# Altium footprint library 布洛电子PCB封装库-通用接插件.PcbLib: 103 footprints (part 4 of 7)
Each footprint in its own frame and in the unit in brackets; x right, y up, seen from the top. Pads: shape width x height; smd on the part's side, far side on the other; paste and mask are expansions set on the pad; w line width, h text height; cw(c..) or ccw(c..) is an arc to the next point about the centre after c.
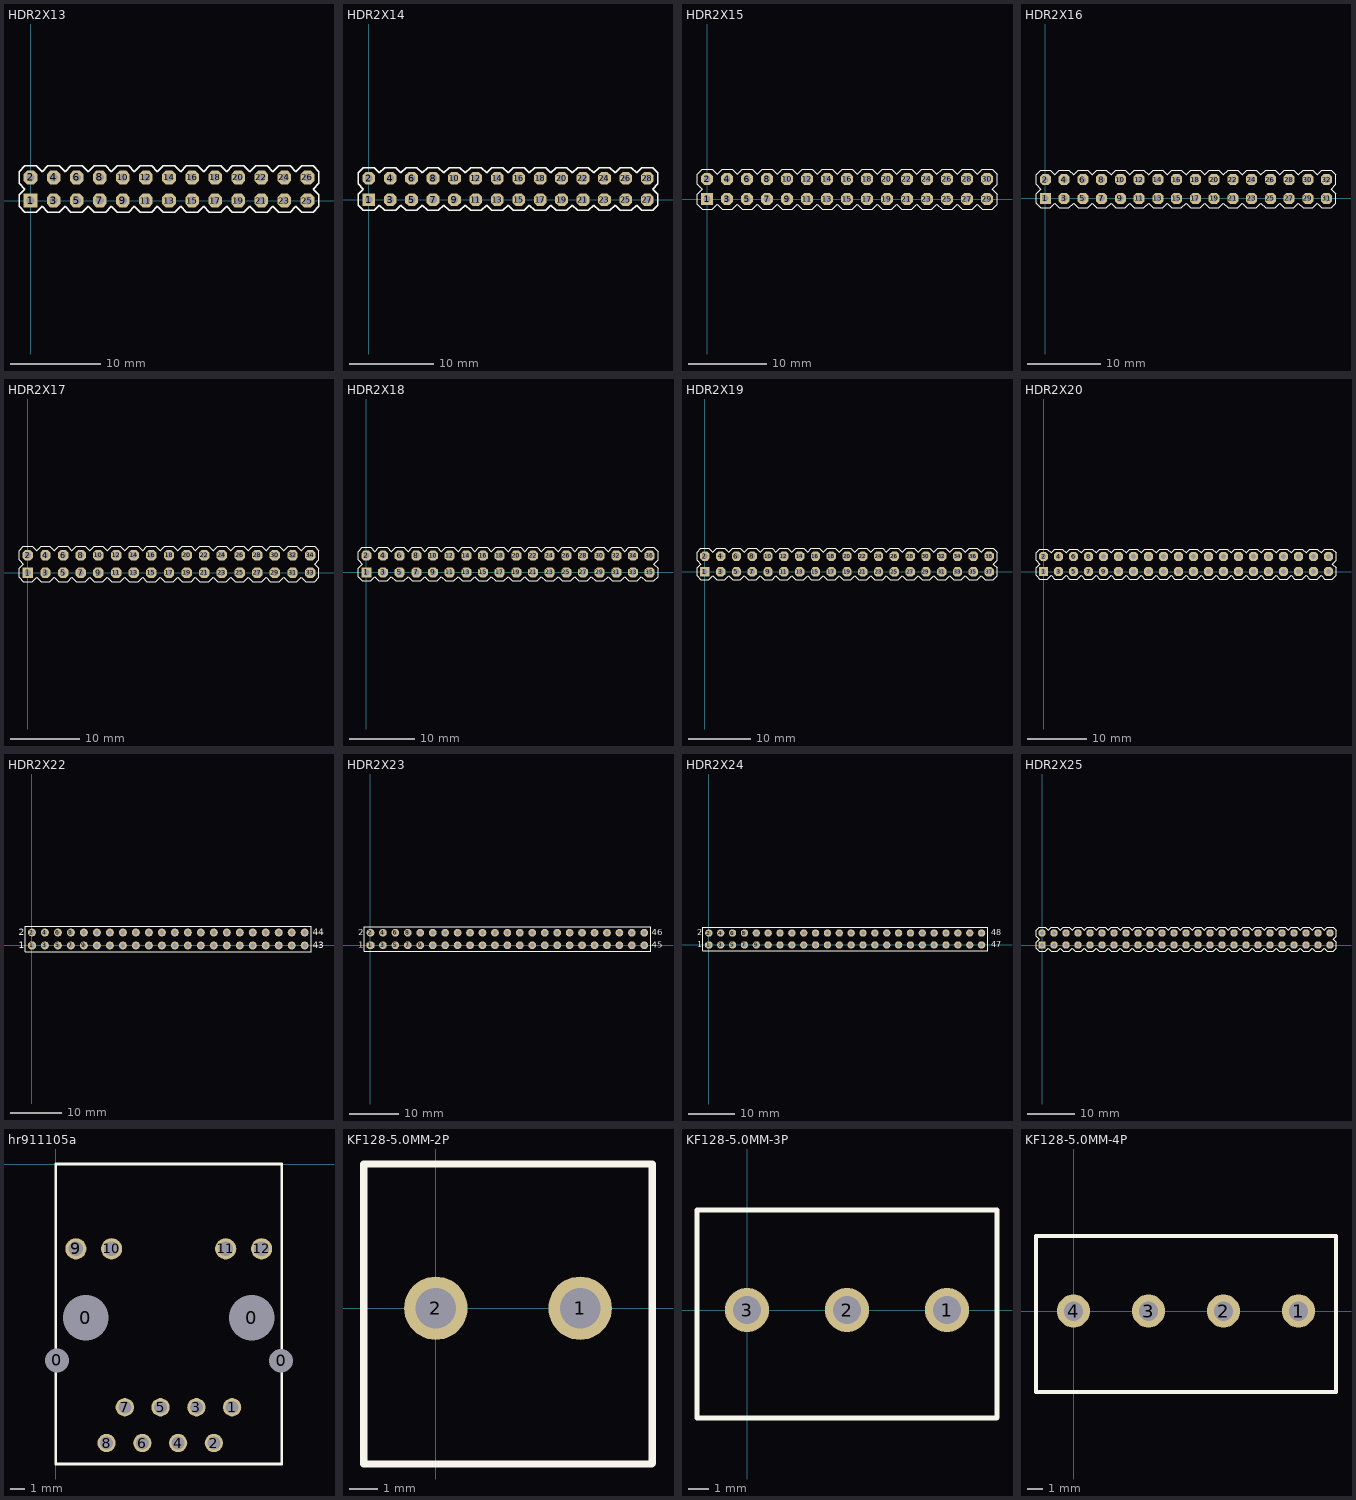
[diagram p3: the footprints below, top view; thin cyan lines are the x and y axes]

## HDR2X13 [mm] "Connector; Header; 13x2 Position"
pads (26):
  rect 1.5x1.5 hole 0.9: 1(0,0)
  oct 1.5x1.5 hole 0.9: 2(0,2.54) 3(2.54,0) 4(2.54,2.54) 5(5.08,0) 6(5.08,2.54) 7(7.62,0) 8(7.62,2.54) 9(10.16,0) 10(10.16,2.54) 11(12.7,0) 12(12.7,2.54) 13(15.24,0) 14(15.24,2.54) 15(17.78,0) 16(17.78,2.54) 17(20.32,0) 18(20.32,2.54) 19(22.86,0) 20(22.86,2.54) 21(25.4,0) 22(25.4,2.54) 23(27.94,0) 24(27.94,2.54) 25(30.48,0) 26(30.48,2.54)
Top Overlay:
  lines w0.152: -1.27,-0.635 -0.635,-1.27 0.635,-1.27 1.27,-0.635 1.905,-1.27 3.175,-1.27 3.81,-0.635 4.445,-1.27 5.715,-1.27 6.35,-0.635 6.985,-1.27 8.255,-1.27 8.89,-0.635 9.525,-1.27 10.795,-1.27 11.43,-0.635 12.065,-1.27 13.335,-1.27 13.97,-0.635 14.605,-1.27 15.875,-1.27 16.51,-0.635 17.145,-1.27 18.415,-1.27 19.05,-0.635 19.685,-1.27 20.955,-1.27 21.59,-0.635 22.225,-1.27 23.495,-1.27 24.13,-0.635 24.765,-1.27 26.035,-1.27 26.67,-0.635 27.305,-1.27 28.575,-1.27 29.21,-0.635 29.845,-1.27 31.115,-1.27 31.75,-0.635 31.75,0.635 31.115,1.27 31.75,1.905 31.75,3.175 31.115,3.81 29.845,3.81 29.21,3.175 28.575,3.81 27.305,3.81 26.67,3.175 26.035,3.81 24.765,3.81 24.13,3.175 23.495,3.81 22.225,3.81 21.59,3.175 20.955,3.81 19.685,3.81 19.05,3.175 18.415,3.81 17.145,3.81 16.51,3.175 15.875,3.81 14.605,3.81 13.97,3.175 13.335,3.81 12.065,3.81 11.43,3.175 10.795,3.81 9.525,3.81 8.89,3.175 8.255,3.81 6.985,3.81 6.35,3.175 5.715,3.81 4.445,3.81 3.81,3.175 3.175,3.81 1.905,3.81 1.27,3.175 0.635,3.81 -0.635,3.81 -1.27,3.175 -1.27,1.905 -0.635,1.27 -1.27,0.635 -1.27,-0.635
3D body: height 7.58, standoff -2.94, extent -1.27,1.27 1.27,3.81
3D body: height 7.58, standoff -2.94, extent -1.27,-1.27 1.27,1.27
3D body: height 7.58, standoff -2.94, extent 1.27,1.27 3.81,3.81
3D body: height 7.58, standoff -2.94, extent 1.27,-1.27 3.81,1.27
3D body: height 7.58, standoff -2.94, extent 3.81,1.27 6.35,3.81
3D body: height 7.58, standoff -2.94, extent 3.81,-1.27 6.35,1.27
3D body: height 7.58, standoff -2.94, extent 6.35,1.27 8.89,3.81
3D body: height 7.58, standoff -2.94, extent 6.35,-1.27 8.89,1.27
3D body: height 7.58, standoff -2.94, extent 8.89,1.27 11.43,3.81
3D body: height 7.58, standoff -2.94, extent 8.89,-1.27 11.43,1.27
3D body: height 7.58, standoff -2.94, extent 11.43,1.27 13.97,3.81
3D body: height 7.58, standoff -2.94, extent 11.43,-1.27 13.97,1.27
3D body: height 7.58, standoff -2.94, extent 13.97,1.27 16.51,3.81
3D body: height 7.58, standoff -2.94, extent 13.97,-1.27 16.51,1.27
3D body: height 7.58, standoff -2.94, extent 16.51,1.27 19.05,3.81
3D body: height 7.58, standoff -2.94, extent 16.51,-1.27 19.05,1.27
3D body: height 7.58, standoff -2.94, extent 19.05,1.27 21.59,3.81
3D body: height 7.58, standoff -2.94, extent 19.05,-1.27 21.59,1.27
3D body: height 7.58, standoff -2.94, extent 21.59,1.27 24.13,3.81
3D body: height 7.58, standoff -2.94, extent 21.59,-1.27 24.13,1.27
3D body: height 7.58, standoff -2.94, extent 24.13,1.27 26.67,3.81
3D body: height 7.58, standoff -2.94, extent 24.13,-1.27 26.67,1.27
3D body: height 7.58, standoff -2.94, extent 26.67,1.27 29.21,3.81
3D body: height 7.58, standoff -2.94, extent 26.67,-1.27 29.21,1.27
3D body: height 7.58, standoff -2.94, extent 29.21,1.27 31.75,3.81
3D body: height 7.58, standoff -2.94, extent 29.21,-1.27 31.75,1.27

## HDR2X14 [mm] "Connector; Header; 14x2 Position"
pads (28):
  rect 1.5x1.5 hole 0.9: 1(0,0)
  oct 1.5x1.5 hole 0.9: 2(0,2.54) 3(2.54,0) 4(2.54,2.54) 5(5.08,0) 6(5.08,2.54) 7(7.62,0) 8(7.62,2.54) 9(10.16,0) 10(10.16,2.54) 11(12.7,0) 12(12.7,2.54) 13(15.24,0) 14(15.24,2.54) 15(17.78,0) 16(17.78,2.54) 17(20.32,0) 18(20.32,2.54) 19(22.86,0) 20(22.86,2.54) 21(25.4,0) 22(25.4,2.54) 23(27.94,0) 24(27.94,2.54) 25(30.48,0) 26(30.48,2.54) 27(33.02,0) 28(33.02,2.54)
Top Overlay:
  lines w0.152: -1.27,-0.635 -1.27,0.635 -0.635,1.27 -1.27,1.905 -1.27,3.175 -0.635,3.81 0.635,3.81 1.27,3.175 1.905,3.81 3.175,3.81 3.81,3.175 4.445,3.81 5.715,3.81 6.35,3.175 6.985,3.81 8.255,3.81 8.89,3.175 9.525,3.81 10.795,3.81 11.43,3.175 12.065,3.81 13.335,3.81 13.97,3.175 14.605,3.81 15.875,3.81 16.51,3.175 17.145,3.81 18.415,3.81 19.05,3.175 19.685,3.81 20.955,3.81 21.59,3.175 22.225,3.81 23.495,3.81 24.13,3.175 24.765,3.81 26.035,3.81 26.67,3.175 27.305,3.81 28.575,3.81 29.21,3.175 29.845,3.81 31.115,3.81 31.75,3.175 32.385,3.81 33.655,3.81 34.29,3.175 34.29,1.905 33.655,1.27 34.29,0.635 34.29,-0.635 33.655,-1.27 32.385,-1.27 31.75,-0.635 31.115,-1.27 29.845,-1.27 29.21,-0.635 28.575,-1.27 27.305,-1.27 26.67,-0.635 26.035,-1.27 24.765,-1.27 24.13,-0.635 23.495,-1.27 22.225,-1.27 21.59,-0.635 20.955,-1.27 19.685,-1.27 19.05,-0.635 18.415,-1.27 17.145,-1.27 16.51,-0.635 15.875,-1.27 14.605,-1.27 13.97,-0.635 13.335,-1.27 12.065,-1.27 11.43,-0.635 10.795,-1.27 9.525,-1.27 8.89,-0.635 8.255,-1.27 6.985,-1.27 6.35,-0.635 5.715,-1.27 4.445,-1.27 3.81,-0.635 3.175,-1.27 1.905,-1.27 1.27,-0.635 0.635,-1.27 -0.635,-1.27 -1.27,-0.635
3D body: height 7.58, standoff -2.94, extent -1.27,-1.27 1.27,1.27
3D body: height 7.58, standoff -2.94, extent 1.27,-1.27 3.81,1.27
3D body: height 7.58, standoff -2.94, extent 3.81,-1.27 6.35,1.27
3D body: height 7.58, standoff -2.94, extent 6.35,-1.27 8.89,1.27
3D body: height 7.58, standoff -2.94, extent -1.27,1.27 1.27,3.81
3D body: height 7.58, standoff -2.94, extent 1.27,1.27 3.81,3.81
3D body: height 7.58, standoff -2.94, extent 3.81,1.27 6.35,3.81
3D body: height 7.58, standoff -2.94, extent 6.35,1.27 8.89,3.81
3D body: height 7.58, standoff -2.94, extent 8.89,-1.27 11.43,1.27
3D body: height 7.58, standoff -2.94, extent 11.43,-1.27 13.97,1.27
3D body: height 7.58, standoff -2.94, extent 13.97,-1.27 16.51,1.27
3D body: height 7.58, standoff -2.94, extent 16.51,-1.27 19.05,1.27
3D body: height 7.58, standoff -2.94, extent 8.89,1.27 11.43,3.81
3D body: height 7.58, standoff -2.94, extent 11.43,1.27 13.97,3.81
3D body: height 7.58, standoff -2.94, extent 13.97,1.27 16.51,3.81
3D body: height 7.58, standoff -2.94, extent 16.51,1.27 19.05,3.81
3D body: height 7.58, standoff -2.94, extent 19.05,-1.27 21.59,1.27
3D body: height 7.58, standoff -2.94, extent 21.59,-1.27 24.13,1.27
3D body: height 7.58, standoff -2.94, extent 24.13,-1.27 26.67,1.27
3D body: height 7.58, standoff -2.94, extent 26.67,-1.27 29.21,1.27
3D body: height 7.58, standoff -2.94, extent 19.05,1.27 21.59,3.81
3D body: height 7.58, standoff -2.94, extent 21.59,1.27 24.13,3.81
3D body: height 7.58, standoff -2.94, extent 24.13,1.27 26.67,3.81
3D body: height 7.58, standoff -2.94, extent 26.67,1.27 29.21,3.81
3D body: height 7.58, standoff -2.94, extent 29.21,-1.27 31.75,1.27
3D body: height 7.58, standoff -2.94, extent 31.75,-1.27 34.29,1.27
3D body: height 7.58, standoff -2.94, extent 29.21,1.27 31.75,3.81
3D body: height 7.58, standoff -2.94, extent 31.75,1.27 34.29,3.81

## HDR2X15 [mm] "Connector; Header; 15x2 Position"
pads (30):
  rect 1.5x1.5 hole 0.9: 1(0,0)
  oct 1.5x1.5 hole 0.9: 2(0,2.54) 3(2.54,0) 4(2.54,2.54) 5(5.08,0) 6(5.08,2.54) 7(7.62,0) 8(7.62,2.54) 9(10.16,0) 10(10.16,2.54) 11(12.7,0) 12(12.7,2.54) 13(15.24,0) 14(15.24,2.54) 15(17.78,0) 16(17.78,2.54) 17(20.32,0) 18(20.32,2.54) 19(22.86,0) 20(22.86,2.54) 21(25.4,0) 22(25.4,2.54) 23(27.94,0) 24(27.94,2.54) 25(30.48,0) 26(30.48,2.54) 27(33.02,0) 28(33.02,2.54) 29(35.56,0) 30(35.56,2.54)
Top Overlay:
  lines w0.152: -1.27,-0.635 -1.27,0.635 -0.635,1.27 -1.27,1.905 -1.27,3.175 -0.635,3.81 0.635,3.81 1.27,3.175 1.905,3.81 3.175,3.81 3.81,3.175 4.445,3.81 5.715,3.81 6.35,3.175 6.985,3.81 8.255,3.81 8.89,3.175 9.525,3.81 10.795,3.81 11.43,3.175 12.065,3.81 13.335,3.81 13.97,3.175 14.605,3.81 15.875,3.81 16.51,3.175 17.145,3.81 18.415,3.81 19.05,3.175 19.685,3.81 20.955,3.81 21.59,3.175 22.225,3.81 23.495,3.81 24.13,3.175 24.765,3.81 26.035,3.81 26.67,3.175 27.305,3.81 28.575,3.81 29.21,3.175 29.845,3.81 31.115,3.81 31.75,3.175 32.385,3.81 33.655,3.81 34.29,3.175 34.925,3.81 36.195,3.81 36.83,3.175 36.83,1.905 36.195,1.27 36.83,0.635 36.83,-0.635 36.195,-1.27 34.925,-1.27 34.29,-0.635 33.655,-1.27 32.385,-1.27 31.75,-0.635 31.115,-1.27 29.845,-1.27 29.21,-0.635 28.575,-1.27 27.305,-1.27 26.67,-0.635 26.035,-1.27 24.765,-1.27 24.13,-0.635 23.495,-1.27 22.225,-1.27 21.59,-0.635 20.955,-1.27 19.685,-1.27 19.05,-0.635 18.415,-1.27 17.145,-1.27 16.51,-0.635 15.875,-1.27 14.605,-1.27 13.97,-0.635 13.335,-1.27 12.065,-1.27 11.43,-0.635 10.795,-1.27 9.525,-1.27 8.89,-0.635 8.255,-1.27 6.985,-1.27 6.35,-0.635 5.715,-1.27 4.445,-1.27 3.81,-0.635 3.175,-1.27 1.905,-1.27 1.27,-0.635 0.635,-1.27 -0.635,-1.27 -1.27,-0.635
3D body: height 7.58, standoff -2.94, extent 34.29,1.27 36.83,3.81
3D body: height 7.58, standoff -2.94, extent 31.75,1.27 34.29,3.81
3D body: height 7.58, standoff -2.94, extent 29.21,1.27 31.75,3.81
3D body: height 7.58, standoff -2.94, extent 34.29,-1.27 36.83,1.27
3D body: height 7.58, standoff -2.94, extent 31.75,-1.27 34.29,1.27
3D body: height 7.58, standoff -2.94, extent 29.21,-1.27 31.75,1.27
3D body: height 7.58, standoff -2.94, extent 26.67,1.27 29.21,3.81
3D body: height 7.58, standoff -2.94, extent 24.13,1.27 26.67,3.81
3D body: height 7.58, standoff -2.94, extent 21.59,1.27 24.13,3.81
3D body: height 7.58, standoff -2.94, extent 19.05,1.27 21.59,3.81
3D body: height 7.58, standoff -2.94, extent 26.67,-1.27 29.21,1.27
3D body: height 7.58, standoff -2.94, extent 24.13,-1.27 26.67,1.27
3D body: height 7.58, standoff -2.94, extent 21.59,-1.27 24.13,1.27
3D body: height 7.58, standoff -2.94, extent 19.05,-1.27 21.59,1.27
3D body: height 7.58, standoff -2.94, extent 16.51,1.27 19.05,3.81
3D body: height 7.58, standoff -2.94, extent 13.97,1.27 16.51,3.81
3D body: height 7.58, standoff -2.94, extent 11.43,1.27 13.97,3.81
3D body: height 7.58, standoff -2.94, extent 8.89,1.27 11.43,3.81
3D body: height 7.58, standoff -2.94, extent 16.51,-1.27 19.05,1.27
3D body: height 7.58, standoff -2.94, extent 13.97,-1.27 16.51,1.27
3D body: height 7.58, standoff -2.94, extent 11.43,-1.27 13.97,1.27
3D body: height 7.58, standoff -2.94, extent 8.89,-1.27 11.43,1.27
3D body: height 7.58, standoff -2.94, extent 6.35,1.27 8.89,3.81
3D body: height 7.58, standoff -2.94, extent 3.81,1.27 6.35,3.81
3D body: height 7.58, standoff -2.94, extent 1.27,1.27 3.81,3.81
3D body: height 7.58, standoff -2.94, extent -1.27,1.27 1.27,3.81
3D body: height 7.58, standoff -2.94, extent 6.35,-1.27 8.89,1.27
3D body: height 7.58, standoff -2.94, extent 3.81,-1.27 6.35,1.27
3D body: height 7.58, standoff -2.94, extent 1.27,-1.27 3.81,1.27
3D body: height 7.58, standoff -2.94, extent -1.27,-1.27 1.27,1.27

## HDR2X16 [mm] "Connector; Header; 16x2 Position"
pads (32):
  rect 1.5x1.5 hole 0.9: 1(0,0)
  oct 1.5x1.5 hole 0.9: 2(0,2.54) 3(2.54,0) 4(2.54,2.54) 5(5.08,0) 6(5.08,2.54) 7(7.62,0) 8(7.62,2.54) 9(10.16,0) 10(10.16,2.54) 11(12.7,0) 12(12.7,2.54) 13(15.24,0) 14(15.24,2.54) 15(17.78,0) 16(17.78,2.54) 17(20.32,0) 18(20.32,2.54) 19(22.86,0) 20(22.86,2.54) 21(25.4,0) 22(25.4,2.54) 23(27.94,0) 24(27.94,2.54) 25(30.48,0) 26(30.48,2.54) 27(33.02,0) 28(33.02,2.54) 29(35.56,0) 30(35.56,2.54) 31(38.1,0) 32(38.1,2.54)
Top Overlay:
  lines w0.152: -1.27,-0.635 -1.27,0.635 -0.635,1.27 -1.27,1.905 -1.27,3.175 -0.635,3.81 0.635,3.81 1.27,3.175 1.905,3.81 3.175,3.81 3.81,3.175 4.445,3.81 5.715,3.81 6.35,3.175 6.985,3.81 8.255,3.81 8.89,3.175 9.525,3.81 10.795,3.81 11.43,3.175 12.065,3.81 13.335,3.81 13.97,3.175 14.605,3.81 15.875,3.81 16.51,3.175 17.145,3.81 18.415,3.81 19.05,3.175 19.685,3.81 20.955,3.81 21.59,3.175 22.225,3.81 23.495,3.81 24.13,3.175 24.765,3.81 26.035,3.81 26.67,3.175 27.305,3.81 28.575,3.81 29.21,3.175 29.845,3.81 31.115,3.81 31.75,3.175 32.385,3.81 33.655,3.81 34.29,3.175 34.925,3.81 36.195,3.81 36.83,3.175 37.465,3.81 38.735,3.81 39.37,3.175 39.37,1.905 38.735,1.27 39.37,0.635 39.37,-0.635 38.735,-1.27 37.465,-1.27 36.83,-0.635 36.195,-1.27 34.925,-1.27 34.29,-0.635 33.655,-1.27 32.385,-1.27 31.75,-0.635 31.115,-1.27 29.845,-1.27 29.21,-0.635 28.575,-1.27 27.305,-1.27 26.67,-0.635 26.035,-1.27 24.765,-1.27 24.13,-0.635 23.495,-1.27 22.225,-1.27 21.59,-0.635 20.955,-1.27 19.685,-1.27 19.05,-0.635 18.415,-1.27 17.145,-1.27 16.51,-0.635 15.875,-1.27 14.605,-1.27 13.97,-0.635 13.335,-1.27 12.065,-1.27 11.43,-0.635 10.795,-1.27 9.525,-1.27 8.89,-0.635 8.255,-1.27 6.985,-1.27 6.35,-0.635 5.715,-1.27 4.445,-1.27 3.81,-0.635 3.175,-1.27 1.905,-1.27 1.27,-0.635 0.635,-1.27 -0.635,-1.27 -1.27,-0.635
3D body: height 7.58, standoff -2.94, extent -1.27,-1.27 1.27,1.27
3D body: height 7.58, standoff -2.94, extent 1.27,-1.27 3.81,1.27
3D body: height 7.58, standoff -2.94, extent 3.81,-1.27 6.35,1.27
3D body: height 7.58, standoff -2.94, extent 6.35,-1.27 8.89,1.27
3D body: height 7.58, standoff -2.94, extent -1.27,1.27 1.27,3.81
3D body: height 7.58, standoff -2.94, extent 1.27,1.27 3.81,3.81
3D body: height 7.58, standoff -2.94, extent 3.81,1.27 6.35,3.81
3D body: height 7.58, standoff -2.94, extent 6.35,1.27 8.89,3.81
3D body: height 7.58, standoff -2.94, extent 8.89,-1.27 11.43,1.27
3D body: height 7.58, standoff -2.94, extent 11.43,-1.27 13.97,1.27
3D body: height 7.58, standoff -2.94, extent 13.97,-1.27 16.51,1.27
3D body: height 7.58, standoff -2.94, extent 16.51,-1.27 19.05,1.27
3D body: height 7.58, standoff -2.94, extent 8.89,1.27 11.43,3.81
3D body: height 7.58, standoff -2.94, extent 11.43,1.27 13.97,3.81
3D body: height 7.58, standoff -2.94, extent 13.97,1.27 16.51,3.81
3D body: height 7.58, standoff -2.94, extent 16.51,1.27 19.05,3.81
3D body: height 7.58, standoff -2.94, extent 19.05,-1.27 21.59,1.27
3D body: height 7.58, standoff -2.94, extent 21.59,-1.27 24.13,1.27
3D body: height 7.58, standoff -2.94, extent 24.13,-1.27 26.67,1.27
3D body: height 7.58, standoff -2.94, extent 26.67,-1.27 29.21,1.27
3D body: height 7.58, standoff -2.94, extent 19.05,1.27 21.59,3.81
3D body: height 7.58, standoff -2.94, extent 21.59,1.27 24.13,3.81
3D body: height 7.58, standoff -2.94, extent 24.13,1.27 26.67,3.81
3D body: height 7.58, standoff -2.94, extent 26.67,1.27 29.21,3.81
3D body: height 7.58, standoff -2.94, extent 29.21,-1.27 31.75,1.27
3D body: height 7.58, standoff -2.94, extent 31.75,-1.27 34.29,1.27
3D body: height 7.58, standoff -2.94, extent 34.29,-1.27 36.83,1.27
3D body: height 7.58, standoff -2.94, extent 36.83,-1.27 39.37,1.27
3D body: height 7.58, standoff -2.94, extent 29.21,1.27 31.75,3.81
3D body: height 7.58, standoff -2.94, extent 31.75,1.27 34.29,3.81
3D body: height 7.58, standoff -2.94, extent 34.29,1.27 36.83,3.81
3D body: height 7.58, standoff -2.94, extent 36.83,1.27 39.37,3.81

## HDR2X17 [mm] "Connector; Header; 17x2 Position"
pads (34):
  rect 1.5x1.5 hole 0.9: 1(0,0)
  oct 1.5x1.5 hole 0.9: 2(0,2.54) 3(2.54,0) 4(2.54,2.54) 5(5.08,0) 6(5.08,2.54) 7(7.62,0) 8(7.62,2.54) 9(10.16,0) 10(10.16,2.54) 11(12.7,0) 12(12.7,2.54) 13(15.24,0) 14(15.24,2.54) 15(17.78,0) 16(17.78,2.54) 17(20.32,0) 18(20.32,2.54) 19(22.86,0) 20(22.86,2.54) 21(25.4,0) 22(25.4,2.54) 23(27.94,0) 24(27.94,2.54) 25(30.48,0) 26(30.48,2.54) 27(33.02,0) 28(33.02,2.54) 29(35.56,0) 30(35.56,2.54) 31(38.1,0) 32(38.1,2.54) 33(40.64,0) 34(40.64,2.54)
Top Overlay:
  lines w0.152: -1.27,-0.635 -0.635,-1.27 0.635,-1.27 1.27,-0.635 1.905,-1.27 3.175,-1.27 3.81,-0.635 4.445,-1.27 5.715,-1.27 6.35,-0.635 6.985,-1.27 8.255,-1.27 8.89,-0.635 9.525,-1.27 10.795,-1.27 11.43,-0.635 12.065,-1.27 13.335,-1.27 13.97,-0.635 14.605,-1.27 15.875,-1.27 16.51,-0.635 17.145,-1.27 18.415,-1.27 19.05,-0.635 19.685,-1.27 20.955,-1.27 21.59,-0.635 22.225,-1.27 23.495,-1.27 24.13,-0.635 24.765,-1.27 26.035,-1.27 26.67,-0.635 27.305,-1.27 28.575,-1.27 29.21,-0.635 29.845,-1.27 31.115,-1.27 31.75,-0.635 32.385,-1.27 33.655,-1.27 34.29,-0.635 34.925,-1.27 36.195,-1.27 36.83,-0.635 37.465,-1.27 38.735,-1.27 39.37,-0.635 40.005,-1.27 41.275,-1.27 41.91,-0.635 41.91,0.635 41.275,1.27 41.91,1.905 41.91,3.175 41.275,3.81 40.005,3.81 39.37,3.175 38.735,3.81 37.465,3.81 36.83,3.175 36.195,3.81 34.925,3.81 34.29,3.175 33.655,3.81 32.385,3.81 31.75,3.175 31.115,3.81 29.845,3.81 29.21,3.175 28.575,3.81 27.305,3.81 26.67,3.175 26.035,3.81 24.765,3.81 24.13,3.175 23.495,3.81 22.225,3.81 21.59,3.175 20.955,3.81 19.685,3.81 19.05,3.175 18.415,3.81 17.145,3.81 16.51,3.175 15.875,3.81 14.605,3.81 13.97,3.175 13.335,3.81 12.065,3.81 11.43,3.175 10.795,3.81 9.525,3.81 8.89,3.175 8.255,3.81 6.985,3.81 6.35,3.175 5.715,3.81 4.445,3.81 3.81,3.175 3.175,3.81 1.905,3.81 1.27,3.175 0.635,3.81 -0.635,3.81 -1.27,3.175 -1.27,1.905 -0.635,1.27 -1.27,0.635 -1.27,-0.635
3D body: height 7.58, standoff -2.94, extent 39.37,1.27 41.91,3.81
3D body: height 7.58, standoff -2.94, extent 39.37,-1.27 41.91,1.27
3D body: height 7.58, standoff -2.94, extent 36.83,1.27 39.37,3.81
3D body: height 7.58, standoff -2.94, extent 34.29,1.27 36.83,3.81
3D body: height 7.58, standoff -2.94, extent 31.75,1.27 34.29,3.81
3D body: height 7.58, standoff -2.94, extent 29.21,1.27 31.75,3.81
3D body: height 7.58, standoff -2.94, extent 36.83,-1.27 39.37,1.27
3D body: height 7.58, standoff -2.94, extent 34.29,-1.27 36.83,1.27
3D body: height 7.58, standoff -2.94, extent 31.75,-1.27 34.29,1.27
3D body: height 7.58, standoff -2.94, extent 29.21,-1.27 31.75,1.27
3D body: height 7.58, standoff -2.94, extent 26.67,1.27 29.21,3.81
3D body: height 7.58, standoff -2.94, extent 24.13,1.27 26.67,3.81
3D body: height 7.58, standoff -2.94, extent 21.59,1.27 24.13,3.81
3D body: height 7.58, standoff -2.94, extent 19.05,1.27 21.59,3.81
3D body: height 7.58, standoff -2.94, extent 26.67,-1.27 29.21,1.27
3D body: height 7.58, standoff -2.94, extent 24.13,-1.27 26.67,1.27
3D body: height 7.58, standoff -2.94, extent 21.59,-1.27 24.13,1.27
3D body: height 7.58, standoff -2.94, extent 19.05,-1.27 21.59,1.27
3D body: height 7.58, standoff -2.94, extent 16.51,1.27 19.05,3.81
3D body: height 7.58, standoff -2.94, extent 13.97,1.27 16.51,3.81
3D body: height 7.58, standoff -2.94, extent 11.43,1.27 13.97,3.81
3D body: height 7.58, standoff -2.94, extent 8.89,1.27 11.43,3.81
3D body: height 7.58, standoff -2.94, extent 16.51,-1.27 19.05,1.27
3D body: height 7.58, standoff -2.94, extent 13.97,-1.27 16.51,1.27
3D body: height 7.58, standoff -2.94, extent 11.43,-1.27 13.97,1.27
3D body: height 7.58, standoff -2.94, extent 8.89,-1.27 11.43,1.27
3D body: height 7.58, standoff -2.94, extent 6.35,1.27 8.89,3.81
3D body: height 7.58, standoff -2.94, extent 3.81,1.27 6.35,3.81
3D body: height 7.58, standoff -2.94, extent 1.27,1.27 3.81,3.81
3D body: height 7.58, standoff -2.94, extent -1.27,1.27 1.27,3.81
3D body: height 7.58, standoff -2.94, extent 6.35,-1.27 8.89,1.27
3D body: height 7.58, standoff -2.94, extent 3.81,-1.27 6.35,1.27
3D body: height 7.58, standoff -2.94, extent 1.27,-1.27 3.81,1.27
3D body: height 7.58, standoff -2.94, extent -1.27,-1.27 1.27,1.27

## HDR2X18 [mm] "Connector; Header; 18x2 Position"
pads (36):
  rect 1.5x1.5 hole 0.9: 1(0,0)
  oct 1.5x1.5 hole 0.9: 2(0,2.54) 3(2.54,0) 4(2.54,2.54) 5(5.08,0) 6(5.08,2.54) 7(7.62,0) 8(7.62,2.54) 9(10.16,0) 10(10.16,2.54) 11(12.7,0) 12(12.7,2.54) 13(15.24,0) 14(15.24,2.54) 15(17.78,0) 16(17.78,2.54) 17(20.32,0) 18(20.32,2.54) 19(22.86,0) 20(22.86,2.54) 21(25.4,0) 22(25.4,2.54) 23(27.94,0) 24(27.94,2.54) 25(30.48,0) 26(30.48,2.54) 27(33.02,0) 28(33.02,2.54) 29(35.56,0) 30(35.56,2.54) 31(38.1,0) 32(38.1,2.54) 33(40.64,0) 34(40.64,2.54) 35(43.18,0) 36(43.18,2.54)
Top Overlay:
  lines w0.152: -1.27,-0.635 -1.27,0.635 -0.635,1.27 -1.27,1.905 -1.27,3.175 -0.635,3.81 0.635,3.81 1.27,3.175 1.905,3.81 3.175,3.81 3.81,3.175 4.445,3.81 5.715,3.81 6.35,3.175 6.985,3.81 8.255,3.81 8.89,3.175 9.525,3.81 10.795,3.81 11.43,3.175 12.065,3.81 13.335,3.81 13.97,3.175 14.605,3.81 15.875,3.81 16.51,3.175 17.145,3.81 18.415,3.81 19.05,3.175 19.685,3.81 20.955,3.81 21.59,3.175 22.225,3.81 23.495,3.81 24.13,3.175 24.765,3.81 26.035,3.81 26.67,3.175 27.305,3.81 28.575,3.81 29.21,3.175 29.845,3.81 31.115,3.81 31.75,3.175 32.385,3.81 33.655,3.81 34.29,3.175 34.925,3.81 36.195,3.81 36.83,3.175 37.465,3.81 38.735,3.81 39.37,3.175 40.005,3.81 41.275,3.81 41.91,3.175 42.545,3.81 43.815,3.81 44.45,3.175 44.45,1.905 43.815,1.27 44.45,0.635 44.45,-0.635 43.815,-1.27 42.545,-1.27 41.91,-0.635 41.275,-1.27 40.005,-1.27 39.37,-0.635 38.735,-1.27 37.465,-1.27 36.83,-0.635 36.195,-1.27 34.925,-1.27 34.29,-0.635 33.655,-1.27 32.385,-1.27 31.75,-0.635 31.115,-1.27 29.845,-1.27 29.21,-0.635 28.575,-1.27 27.305,-1.27 26.67,-0.635 26.035,-1.27 24.765,-1.27 24.13,-0.635 23.495,-1.27 22.225,-1.27 21.59,-0.635 20.955,-1.27 19.685,-1.27 19.05,-0.635 18.415,-1.27 17.145,-1.27 16.51,-0.635 15.875,-1.27 14.605,-1.27 13.97,-0.635 13.335,-1.27 12.065,-1.27 11.43,-0.635 10.795,-1.27 9.525,-1.27 8.89,-0.635 8.255,-1.27 6.985,-1.27 6.35,-0.635 5.715,-1.27 4.445,-1.27 3.81,-0.635 3.175,-1.27 1.905,-1.27 1.27,-0.635 0.635,-1.27 -0.635,-1.27 -1.27,-0.635
3D body: height 7.58, standoff -2.94, extent -1.27,-1.27 1.27,1.27
3D body: height 7.58, standoff -2.94, extent 1.27,-1.27 3.81,1.27
3D body: height 7.58, standoff -2.94, extent 3.81,-1.27 6.35,1.27
3D body: height 7.58, standoff -2.94, extent 6.35,-1.27 8.89,1.27
3D body: height 7.58, standoff -2.94, extent -1.27,1.27 1.27,3.81
3D body: height 7.58, standoff -2.94, extent 1.27,1.27 3.81,3.81
3D body: height 7.58, standoff -2.94, extent 3.81,1.27 6.35,3.81
3D body: height 7.58, standoff -2.94, extent 6.35,1.27 8.89,3.81
3D body: height 7.58, standoff -2.94, extent 8.89,-1.27 11.43,1.27
3D body: height 7.58, standoff -2.94, extent 11.43,-1.27 13.97,1.27
3D body: height 7.58, standoff -2.94, extent 13.97,-1.27 16.51,1.27
3D body: height 7.58, standoff -2.94, extent 16.51,-1.27 19.05,1.27
3D body: height 7.58, standoff -2.94, extent 8.89,1.27 11.43,3.81
3D body: height 7.58, standoff -2.94, extent 11.43,1.27 13.97,3.81
3D body: height 7.58, standoff -2.94, extent 13.97,1.27 16.51,3.81
3D body: height 7.58, standoff -2.94, extent 16.51,1.27 19.05,3.81
3D body: height 7.58, standoff -2.94, extent 19.05,-1.27 21.59,1.27
3D body: height 7.58, standoff -2.94, extent 21.59,-1.27 24.13,1.27
3D body: height 7.58, standoff -2.94, extent 24.13,-1.27 26.67,1.27
3D body: height 7.58, standoff -2.94, extent 26.67,-1.27 29.21,1.27
3D body: height 7.58, standoff -2.94, extent 19.05,1.27 21.59,3.81
3D body: height 7.58, standoff -2.94, extent 21.59,1.27 24.13,3.81
3D body: height 7.58, standoff -2.94, extent 24.13,1.27 26.67,3.81
3D body: height 7.58, standoff -2.94, extent 26.67,1.27 29.21,3.81
3D body: height 7.58, standoff -2.94, extent 29.21,-1.27 31.75,1.27
3D body: height 7.58, standoff -2.94, extent 31.75,-1.27 34.29,1.27
3D body: height 7.58, standoff -2.94, extent 34.29,-1.27 36.83,1.27
3D body: height 7.58, standoff -2.94, extent 36.83,-1.27 39.37,1.27
3D body: height 7.58, standoff -2.94, extent 29.21,1.27 31.75,3.81
3D body: height 7.58, standoff -2.94, extent 31.75,1.27 34.29,3.81
3D body: height 7.58, standoff -2.94, extent 34.29,1.27 36.83,3.81
3D body: height 7.58, standoff -2.94, extent 36.83,1.27 39.37,3.81
3D body: height 7.58, standoff -2.94, extent 39.37,-1.27 41.91,1.27
3D body: height 7.58, standoff -2.94, extent 41.91,-1.27 44.45,1.27
3D body: height 7.58, standoff -2.94, extent 39.37,1.27 41.91,3.81
3D body: height 7.58, standoff -2.94, extent 41.91,1.27 44.45,3.81

## HDR2X19 [mm] "Connector; Header; 19x2 Position"
pads (38):
  rect 1.5x1.5 hole 0.9: 1(0,0)
  oct 1.5x1.5 hole 0.9: 2(0,2.54) 3(2.54,0) 4(2.54,2.54) 5(5.08,0) 6(5.08,2.54) 7(7.62,0) 8(7.62,2.54) 9(10.16,0) 10(10.16,2.54) 11(12.7,0) 12(12.7,2.54) 13(15.24,0) 14(15.24,2.54) 15(17.78,0) 16(17.78,2.54) 17(20.32,0) 18(20.32,2.54) 19(22.86,0) 20(22.86,2.54) 21(25.4,0) 22(25.4,2.54) 23(27.94,0) 24(27.94,2.54) 25(30.48,0) 26(30.48,2.54) 27(33.02,0) 28(33.02,2.54) 29(35.56,0) 30(35.56,2.54) 31(38.1,0) 32(38.1,2.54) 33(40.64,0) 34(40.64,2.54) 35(43.18,0) 36(43.18,2.54) 37(45.72,0) 38(45.72,2.54)
Top Overlay:
  lines w0.152: -1.27,-0.635 -0.635,-1.27 0.635,-1.27 1.27,-0.635 1.905,-1.27 3.175,-1.27 3.81,-0.635 4.445,-1.27 5.715,-1.27 6.35,-0.635 6.985,-1.27 8.255,-1.27 8.89,-0.635 9.525,-1.27 10.795,-1.27 11.43,-0.635 12.065,-1.27 13.335,-1.27 13.97,-0.635 14.605,-1.27 15.875,-1.27 16.51,-0.635 17.145,-1.27 18.415,-1.27 19.05,-0.635 19.685,-1.27 20.955,-1.27 21.59,-0.635 22.225,-1.27 23.495,-1.27 24.13,-0.635 24.765,-1.27 26.035,-1.27 26.67,-0.635 27.305,-1.27 28.575,-1.27 29.21,-0.635 29.845,-1.27 31.115,-1.27 31.75,-0.635 32.385,-1.27 33.655,-1.27 34.29,-0.635 34.925,-1.27 36.195,-1.27 36.83,-0.635 37.465,-1.27 38.735,-1.27 39.37,-0.635 40.005,-1.27 41.275,-1.27 41.91,-0.635 42.545,-1.27 43.815,-1.27 44.45,-0.635 45.085,-1.27 46.355,-1.27 46.99,-0.635 46.99,0.635 46.355,1.27 46.99,1.905 46.99,3.175 46.355,3.81 45.085,3.81 44.45,3.175 43.815,3.81 42.545,3.81 41.91,3.175 41.275,3.81 40.005,3.81 39.37,3.175 38.735,3.81 37.465,3.81 36.83,3.175 36.195,3.81 34.925,3.81 34.29,3.175 33.655,3.81 32.385,3.81 31.75,3.175 31.115,3.81 29.845,3.81 29.21,3.175 28.575,3.81 27.305,3.81 26.67,3.175 26.035,3.81 24.765,3.81 24.13,3.175 23.495,3.81 22.225,3.81 21.59,3.175 20.955,3.81 19.685,3.81 19.05,3.175 18.415,3.81 17.145,3.81 16.51,3.175 15.875,3.81 14.605,3.81 13.97,3.175 13.335,3.81 12.065,3.81 11.43,3.175 10.795,3.81 9.525,3.81 8.89,3.175 8.255,3.81 6.985,3.81 6.35,3.175 5.715,3.81 4.445,3.81 3.81,3.175 3.175,3.81 1.905,3.81 1.27,3.175 0.635,3.81 -0.635,3.81 -1.27,3.175 -1.27,1.905 -0.635,1.27 -1.27,0.635 -1.27,-0.635
3D body: height 7.58, standoff -2.94, extent -1.27,-1.27 1.27,1.27
3D body: height 7.58, standoff -2.94, extent 1.27,-1.27 3.81,1.27
3D body: height 7.58, standoff -2.94, extent 3.81,-1.27 6.35,1.27
3D body: height 7.58, standoff -2.94, extent 6.35,-1.27 8.89,1.27
3D body: height 7.58, standoff -2.94, extent -1.27,1.27 1.27,3.81
3D body: height 7.58, standoff -2.94, extent 1.27,1.27 3.81,3.81
3D body: height 7.58, standoff -2.94, extent 3.81,1.27 6.35,3.81
3D body: height 7.58, standoff -2.94, extent 6.35,1.27 8.89,3.81
3D body: height 7.58, standoff -2.94, extent 8.89,-1.27 11.43,1.27
3D body: height 7.58, standoff -2.94, extent 11.43,-1.27 13.97,1.27
3D body: height 7.58, standoff -2.94, extent 13.97,-1.27 16.51,1.27
3D body: height 7.58, standoff -2.94, extent 16.51,-1.27 19.05,1.27
3D body: height 7.58, standoff -2.94, extent 8.89,1.27 11.43,3.81
3D body: height 7.58, standoff -2.94, extent 11.43,1.27 13.97,3.81
3D body: height 7.58, standoff -2.94, extent 13.97,1.27 16.51,3.81
3D body: height 7.58, standoff -2.94, extent 16.51,1.27 19.05,3.81
3D body: height 7.58, standoff -2.94, extent 19.05,-1.27 21.59,1.27
3D body: height 7.58, standoff -2.94, extent 21.59,-1.27 24.13,1.27
3D body: height 7.58, standoff -2.94, extent 24.13,-1.27 26.67,1.27
3D body: height 7.58, standoff -2.94, extent 26.67,-1.27 29.21,1.27
3D body: height 7.58, standoff -2.94, extent 19.05,1.27 21.59,3.81
3D body: height 7.58, standoff -2.94, extent 21.59,1.27 24.13,3.81
3D body: height 7.58, standoff -2.94, extent 24.13,1.27 26.67,3.81
3D body: height 7.58, standoff -2.94, extent 26.67,1.27 29.21,3.81
3D body: height 7.58, standoff -2.94, extent 29.21,-1.27 31.75,1.27
3D body: height 7.58, standoff -2.94, extent 31.75,-1.27 34.29,1.27
3D body: height 7.58, standoff -2.94, extent 34.29,-1.27 36.83,1.27
3D body: height 7.58, standoff -2.94, extent 36.83,-1.27 39.37,1.27
3D body: height 7.58, standoff -2.94, extent 29.21,1.27 31.75,3.81
3D body: height 7.58, standoff -2.94, extent 31.75,1.27 34.29,3.81
3D body: height 7.58, standoff -2.94, extent 34.29,1.27 36.83,3.81
3D body: height 7.58, standoff -2.94, extent 36.83,1.27 39.37,3.81
3D body: height 7.58, standoff -2.94, extent 39.37,-1.27 41.91,1.27
3D body: height 7.58, standoff -2.94, extent 41.91,-1.27 44.45,1.27
3D body: height 7.58, standoff -2.94, extent 44.45,-1.27 46.99,1.27
3D body: height 7.58, standoff -2.94, extent 39.37,1.27 41.91,3.81
3D body: height 7.58, standoff -2.94, extent 41.91,1.27 44.45,3.81
3D body: height 7.58, standoff -2.94, extent 44.45,1.27 46.99,3.81

## HDR2X20 [mm] "Connector; Header; 20x2 Position"
pads (40):
  rect 1.5x1.5 hole 0.9: 1(0,0)
  oct 1.5x1.5 hole 0.9: 2(0,2.54) 3(2.54,0) 4(2.54,2.54) 5(5.08,0) 6(5.08,2.54) 7(7.62,0) 8(7.62,2.54) 9(10.16,0) 10(10.16,2.54) 11(12.7,0) 12(12.7,2.54) 13(15.24,0) 14(15.24,2.54) 15(17.78,0) 16(17.78,2.54) 17(20.32,0) 18(20.32,2.54) 19(22.86,0) 20(22.86,2.54) 21(25.4,0) 22(25.4,2.54) 23(27.94,0) 24(27.94,2.54) 25(30.48,0) 26(30.48,2.54) 27(33.02,0) 28(33.02,2.54) 29(35.56,0) 30(35.56,2.54) 31(38.1,0) 32(38.1,2.54) 33(40.64,0) 34(40.64,2.54) 35(43.18,0) 36(43.18,2.54) 37(45.72,0) 38(45.72,2.54) 39(48.26,0) 40(48.26,2.54)
Top Overlay:
  lines w0.152: -1.27,-0.635 -1.27,0.635 -0.635,1.27 -1.27,1.905 -1.27,3.175 -0.635,3.81 0.635,3.81 1.27,3.175 1.905,3.81 3.175,3.81 3.81,3.175 4.445,3.81 5.715,3.81 6.35,3.175 6.985,3.81 8.255,3.81 8.89,3.175 9.525,3.81 10.795,3.81 11.43,3.175 12.065,3.81 13.335,3.81 13.97,3.175 14.605,3.81 15.875,3.81 16.51,3.175 17.145,3.81 18.415,3.81 19.05,3.175 19.685,3.81 20.955,3.81 21.59,3.175 22.225,3.81 23.495,3.81 24.13,3.175 24.765,3.81 26.035,3.81 26.67,3.175 27.305,3.81 28.575,3.81 29.21,3.175 29.845,3.81 31.115,3.81 31.75,3.175 32.385,3.81 33.655,3.81 34.29,3.175 34.925,3.81 36.195,3.81 36.83,3.175 37.465,3.81 38.735,3.81 39.37,3.175 40.005,3.81 41.275,3.81 41.91,3.175 42.545,3.81 43.815,3.81 44.45,3.175 45.085,3.81 46.355,3.81 46.99,3.175 47.625,3.81 48.895,3.81 49.53,3.175 49.53,1.905 48.895,1.27 49.53,0.635 49.53,-0.635 48.895,-1.27 47.625,-1.27 46.99,-0.635 46.355,-1.27 45.085,-1.27 44.45,-0.635 43.815,-1.27 42.545,-1.27 41.91,-0.635 41.275,-1.27 40.005,-1.27 39.37,-0.635 38.735,-1.27 37.465,-1.27 36.83,-0.635 36.195,-1.27 34.925,-1.27 34.29,-0.635 33.655,-1.27 32.385,-1.27 31.75,-0.635 31.115,-1.27 29.845,-1.27 29.21,-0.635 28.575,-1.27 27.305,-1.27 26.67,-0.635 26.035,-1.27 24.765,-1.27 24.13,-0.635 23.495,-1.27 22.225,-1.27 21.59,-0.635 20.955,-1.27 19.685,-1.27 19.05,-0.635 18.415,-1.27 17.145,-1.27 16.51,-0.635 15.875,-1.27 14.605,-1.27 13.97,-0.635 13.335,-1.27 12.065,-1.27 11.43,-0.635 10.795,-1.27 9.525,-1.27 8.89,-0.635 8.255,-1.27 6.985,-1.27 6.35,-0.635 5.715,-1.27 4.445,-1.27 3.81,-0.635 3.175,-1.27 1.905,-1.27 1.27,-0.635 0.635,-1.27 -0.635,-1.27 -1.27,-0.635
3D body: height 7.58, standoff -2.94, extent 6.35,1.27 8.89,3.81
3D body: height 7.58, standoff -2.94, extent 3.81,1.27 6.35,3.81
3D body: height 7.58, standoff -2.94, extent 1.27,1.27 3.81,3.81
3D body: height 7.58, standoff -2.94, extent -1.27,1.27 1.27,3.81
3D body: height 7.58, standoff -2.94, extent 6.35,-1.27 8.89,1.27
3D body: height 7.58, standoff -2.94, extent 3.81,-1.27 6.35,1.27
3D body: height 7.58, standoff -2.94, extent 1.27,-1.27 3.81,1.27
3D body: height 7.58, standoff -2.94, extent -1.27,-1.27 1.27,1.27
3D body: height 7.58, standoff -2.94, extent 8.89,-1.27 11.43,1.27
3D body: height 7.58, standoff -2.94, extent 11.43,-1.27 13.97,1.27
3D body: height 7.58, standoff -2.94, extent 13.97,-1.27 16.51,1.27
3D body: height 7.58, standoff -2.94, extent 16.51,-1.27 19.05,1.27
3D body: height 7.58, standoff -2.94, extent 8.89,1.27 11.43,3.81
3D body: height 7.58, standoff -2.94, extent 11.43,1.27 13.97,3.81
3D body: height 7.58, standoff -2.94, extent 13.97,1.27 16.51,3.81
3D body: height 7.58, standoff -2.94, extent 16.51,1.27 19.05,3.81
3D body: height 7.58, standoff -2.94, extent 19.05,-1.27 21.59,1.27
3D body: height 7.58, standoff -2.94, extent 21.59,-1.27 24.13,1.27
3D body: height 7.58, standoff -2.94, extent 24.13,-1.27 26.67,1.27
3D body: height 7.58, standoff -2.94, extent 26.67,-1.27 29.21,1.27
3D body: height 7.58, standoff -2.94, extent 19.05,1.27 21.59,3.81
3D body: height 7.58, standoff -2.94, extent 21.59,1.27 24.13,3.81
3D body: height 7.58, standoff -2.94, extent 24.13,1.27 26.67,3.81
3D body: height 7.58, standoff -2.94, extent 26.67,1.27 29.21,3.81
3D body: height 7.58, standoff -2.94, extent 29.21,-1.27 31.75,1.27
3D body: height 7.58, standoff -2.94, extent 31.75,-1.27 34.29,1.27
3D body: height 7.58, standoff -2.94, extent 34.29,-1.27 36.83,1.27
3D body: height 7.58, standoff -2.94, extent 36.83,-1.27 39.37,1.27
3D body: height 7.58, standoff -2.94, extent 29.21,1.27 31.75,3.81
3D body: height 7.58, standoff -2.94, extent 31.75,1.27 34.29,3.81
3D body: height 7.58, standoff -2.94, extent 34.29,1.27 36.83,3.81
3D body: height 7.58, standoff -2.94, extent 36.83,1.27 39.37,3.81
3D body: height 7.58, standoff -2.94, extent 39.37,-1.27 41.91,1.27
3D body: height 7.58, standoff -2.94, extent 41.91,-1.27 44.45,1.27
3D body: height 7.58, standoff -2.94, extent 44.45,-1.27 46.99,1.27
3D body: height 7.58, standoff -2.94, extent 46.99,-1.27 49.53,1.27
3D body: height 7.58, standoff -2.94, extent 39.37,1.27 41.91,3.81
3D body: height 7.58, standoff -2.94, extent 41.91,1.27 44.45,3.81
3D body: height 7.58, standoff -2.94, extent 44.45,1.27 46.99,3.81
3D body: height 7.58, standoff -2.94, extent 46.99,1.27 49.53,3.81

## HDR2X22 [mil]
pads (44):
  oct 62x62 hole 35: 1(0,0)
  round 62 hole 35: 2(0,100) 3(100,0) 4(100,100) 5(200,0) 6(200,100) 7(300,0) 8(300,100) 9(400,0) 10(400,100) 11(500,0) 12(500,100) 13(600,0) 14(600,100) 15(700,0) 16(700,100) 17(800,0) 18(800,100) 19(900,0) 20(900,100) 21(1000,0) 22(1000,100) 23(1100,0) 24(1100,100) 25(1200,0) 26(1200,100) 27(1300,0) 28(1300,100) 29(1400,0) 30(1400,100) 31(1500,0) 32(1500,100) 33(1600,0) 34(1600,100) 35(1700,0) 36(1700,100) 37(1800,0) 38(1800,100) 39(1900,0) 40(1900,100) 41(2000,0) 42(2000,100) 43(2100,0) 44(2100,100)
Top Overlay:
  lines w8: -50,-50 2150,-50 2150,150 -50,150 -50,-50
  text "2" at -100,80 h50
  text "1" at -100,-20 h50
  text "44" at 2160,80 h50
  text "43" at 2160,-20 h50
3D body: height 334.65, standoff -118.11, extent -50,-50 2150,150

## HDR2X23 [mil]
pads (46):
  oct 62x62 hole 35: 1(0,0)
  round 62 hole 35: 2(0,100) 3(100,0) 4(100,100) 5(200,0) 6(200,100) 7(300,0) 8(300,100) 9(400,0) 10(400,100) 11(500,0) 12(500,100) 13(600,0) 14(600,100) 15(700,0) 16(700,100) 17(800,0) 18(800,100) 19(900,0) 20(900,100) 21(1000,0) 22(1000,100) 23(1100,0) 24(1100,100) 25(1200,0) 26(1200,100) 27(1300,0) 28(1300,100) 29(1400,0) 30(1400,100) 31(1500,0) 32(1500,100) 33(1600,0) 34(1600,100) 35(1700,0) 36(1700,100) 37(1800,0) 38(1800,100) 39(1900,0) 40(1900,100) 41(2000,0) 42(2000,100) 43(2100,0) 44(2100,100) 45(2200,0) 46(2200,100)
Top Overlay:
  lines w8: -50,-50 -50,150 2250,150 2250,-50 -50,-50
  text "2" at -100,80 h50
  text "1" at -100,-20 h50
  text "45" at 2260,-20 h50
  text "46" at 2260,80 h50
3D body: height 334.65, standoff -118.11, extent -50,-50 2250,150

## HDR2X24 [mil]
pads (48):
  oct 62x62 hole 35: 1(0,0)
  round 62 hole 35: 2(0,100) 3(100,0) 4(100,100) 5(200,0) 6(200,100) 7(300,0) 8(300,100) 9(400,0) 10(400,100) 11(500,0) 12(500,100) 13(600,0) 14(600,100) 15(700,0) 16(700,100) 17(800,0) 18(800,100) 19(900,0) 20(900,100) 21(1000,0) 22(1000,100) 23(1100,0) 24(1100,100) 25(1200,0) 26(1200,100) 27(1300,0) 28(1300,100) 29(1400,0) 30(1400,100) 31(1500,0) 32(1500,100) 33(1600,0) 34(1600,100) 35(1700,0) 36(1700,100) 37(1800,0) 38(1800,100) 39(1900,0) 40(1900,100) 41(2000,0) 42(2000,100) 43(2100,0) 44(2100,100) 45(2200,0) 46(2200,100) 47(2300,0) 48(2300,100)
Top Overlay:
  lines w8: -50,-50 -50,150 2350,150 2350,-50 -50,-50
  text "47" at 2380,-20 h50
  text "48" at 2380,80 h50
  text "1" at -100,-20 h50
  text "2" at -100,80 h50
3D body: height 334.65, standoff -118.11, extent -50,-50 2350,150

## HDR2X25 [mm]
pads (50):
  rect 1.5x1.5 hole 0.9: 1(0,0)
  oct 1.5x1.5 hole 0.9: 2(0,2.54) 3(2.54,0) 4(2.54,2.54) 5(5.08,0) 6(5.08,2.54) 7(7.62,0) 8(7.62,2.54) 9(10.16,0) 10(10.16,2.54) 11(12.7,0) 12(12.7,2.54) 13(15.24,0) 14(15.24,2.54) 15(17.78,0) 16(17.78,2.54) 17(20.32,0) 18(20.32,2.54) 19(22.86,0) 20(22.86,2.54) 21(25.4,0) 22(25.4,2.54) 23(27.94,0) 24(27.94,2.54) 25(30.48,0) 26(30.48,2.54) 27(33.02,0) 28(33.02,2.54) 29(35.56,0) 30(35.56,2.54) 31(38.1,0) 32(38.1,2.54) 33(40.64,0) 34(40.64,2.54) 35(43.18,0) 36(43.18,2.54) 37(45.72,0) 38(45.72,2.54) 39(48.26,0) 40(48.26,2.54) 41(50.8,0) 42(50.8,2.54) 43(53.34,0) 44(53.34,2.54) 45(55.88,0) 46(55.88,2.54) 47(58.42,0) 48(58.42,2.54) 49(60.96,0) 50(60.96,2.54)
Top Overlay:
  drawing of 158 lines, arcs and shapes, not listed
3D body: height 7.58, standoff -2.94, extent 6.35,1.27 8.89,3.81
3D body: height 7.58, standoff -2.94, extent 3.81,1.27 6.35,3.81
3D body: height 7.58, standoff -2.94, extent 1.27,1.27 3.81,3.81
3D body: height 7.58, standoff -2.94, extent -1.27,1.27 1.27,3.81
3D body: height 7.58, standoff -2.94, extent 6.35,-1.27 8.89,1.27
3D body: height 7.58, standoff -2.94, extent 3.81,-1.27 6.35,1.27
3D body: height 7.58, standoff -2.94, extent 1.27,-1.27 3.81,1.27
3D body: height 7.58, standoff -2.94, extent -1.27,-1.27 1.27,1.27
3D body: height 7.58, standoff -2.94, extent 8.89,-1.27 11.43,1.27
3D body: height 7.58, standoff -2.94, extent 11.43,-1.27 13.97,1.27
3D body: height 7.58, standoff -2.94, extent 13.97,-1.27 16.51,1.27
3D body: height 7.58, standoff -2.94, extent 16.51,-1.27 19.05,1.27
3D body: height 7.58, standoff -2.94, extent 8.89,1.27 11.43,3.81
3D body: height 7.58, standoff -2.94, extent 11.43,1.27 13.97,3.81
3D body: height 7.58, standoff -2.94, extent 13.97,1.27 16.51,3.81
3D body: height 7.58, standoff -2.94, extent 16.51,1.27 19.05,3.81
3D body: height 7.58, standoff -2.94, extent 19.05,-1.27 21.59,1.27
3D body: height 7.58, standoff -2.94, extent 21.59,-1.27 24.13,1.27
3D body: height 7.58, standoff -2.94, extent 24.13,-1.27 26.67,1.27
3D body: height 7.58, standoff -2.94, extent 26.67,-1.27 29.21,1.27
3D body: height 7.58, standoff -2.94, extent 19.05,1.27 21.59,3.81
3D body: height 7.58, standoff -2.94, extent 21.59,1.27 24.13,3.81
3D body: height 7.58, standoff -2.94, extent 24.13,1.27 26.67,3.81
3D body: height 7.58, standoff -2.94, extent 26.67,1.27 29.21,3.81
3D body: height 7.58, standoff -2.94, extent 29.21,-1.27 31.75,1.27
3D body: height 7.58, standoff -2.94, extent 31.75,-1.27 34.29,1.27
3D body: height 7.58, standoff -2.94, extent 34.29,-1.27 36.83,1.27
3D body: height 7.58, standoff -2.94, extent 36.83,-1.27 39.37,1.27
3D body: height 7.58, standoff -2.94, extent 29.21,1.27 31.75,3.81
3D body: height 7.58, standoff -2.94, extent 31.75,1.27 34.29,3.81
3D body: height 7.58, standoff -2.94, extent 34.29,1.27 36.83,3.81
3D body: height 7.58, standoff -2.94, extent 36.83,1.27 39.37,3.81
3D body: height 7.58, standoff -2.94, extent 39.37,-1.27 41.91,1.27
3D body: height 7.58, standoff -2.94, extent 41.91,-1.27 44.45,1.27
3D body: height 7.58, standoff -2.94, extent 44.45,-1.27 46.99,1.27
3D body: height 7.58, standoff -2.94, extent 46.99,-1.27 49.53,1.27
3D body: height 7.58, standoff -2.94, extent 39.37,1.27 41.91,3.81
3D body: height 7.58, standoff -2.94, extent 41.91,1.27 44.45,3.81
3D body: height 7.58, standoff -2.94, extent 44.45,1.27 46.99,3.81
3D body: height 7.58, standoff -2.94, extent 46.99,1.27 49.53,3.81
3D body: height 7.58, standoff -2.94, extent 49.53,1.27 52.07,3.81
3D body: height 7.58, standoff -2.94, extent 52.07,1.27 54.61,3.81
3D body: height 7.58, standoff -2.94, extent 54.61,1.27 57.15,3.81
3D body: height 7.58, standoff -2.94, extent 57.15,1.27 59.69,3.81
3D body: height 7.58, standoff -2.94, extent 59.69,1.27 62.23,3.81
3D body: height 7.58, standoff -2.94, extent 59.69,-1.27 62.23,1.27
3D body: height 7.58, standoff -2.94, extent 57.15,-1.27 59.69,1.27
3D body: height 7.58, standoff -2.94, extent 54.61,-1.27 57.15,1.27
3D body: height 7.58, standoff -2.94, extent 52.07,-1.27 54.61,1.27
3D body: height 7.58, standoff -2.94, extent 49.53,-1.27 52.07,1.27

## hr911105a [mm]
pads (16):
  round 1.5 hole 1.7: 0(0.076,-13.945) 0(16.002,-13.97)
  round 1.8 hole 3.25: 0(2.132,-10.92) 0(13.908,-10.922)
  round 1.3 hole 0.92: 1(12.522,-17.272) 2(11.227,-19.812) 3(9.982,-17.272) 4(8.69,-19.812) 5(7.44,-17.272) 6(6.147,-19.812) 7(4.902,-17.272) 8(3.607,-19.812)
  round 1.5 hole 1.05: 9(1.425,-6.02) 10(3.962,-6.02) 11(12.065,-6.02) 12(14.615,-6.02)
Top Overlay:
  lines w0.203: 0,-21.3 16.04,-21.3 16.04,0 0,0 0,-21.3
3D body: height 13.59, standoff -2.91, extent 0.076,-21.393 15.956,0.007

## KF128-5.0MM-2P [mm]
pads (2):
  round 2.2 hole 1.4: 1(5,0) 2(0,0)
Top Overlay:
  lines w0.254: -2.5,-5.4 7.485,-5.4 7.5,-5.385 7.5,5 -2.5,5 -2.5,-5.4
3D body: height 14, standoff -4, extent -2.5,-5.5 7.5,5

## KF128-5.0MM-3P [mm]
pads (3):
  round 2.2 hole 1.4: 1(10,0) 2(5,0) 3(0,0)
Top Overlay:
  lines w0.254: -2.5,-5.4 12.485,-5.4 12.5,-5.385 12.5,5 -2.5,5 -2.5,0 -2.5,-5.385
3D body: height 14, standoff -4, extent -2.5,-5.385 12.5,5.115

## KF128-5.0MM-4P [mm]
pads (4):
  round 2.2 hole 1.3: 1(15,0) 2(10,0) 3(5,0) 4(0,0)
Top Overlay:
  lines w0.254: -2.5,-5.4 -2.5,5 17.5,5 17.5,-5.4 -2.5,-5.4
3D body: height 14, standoff -4, extent -2.518,-5.5 7.482,5
3D body: height 14, standoff -4, extent 7.5,-5.5 17.5,5